# Altium integrated library 860010374011_Altium_WCAP-ATG8_rev19a.IntLib: 195 symbols (part 1 of 2) (continued)
## 860010575014
designator C?, comment 560uF, 35V
WCAP-ATG8 THT Aluminum Electrolytic Capacitors, D10mm x L20mm, 560uF, +/-20%, 35VDC; Part Number: 860010575014; Dissipation Factor: 12%; Endurance: 2000h; Leakage Current: 196uA; Ripple Current max.: 847mA; Technical Reference: ATBF200561M035DSPAAB000; ComponentLink1Description: Manufacturer; ComponentLink1URL: http://www.we-online.de; ComponentLink2Description: Datasheet; ComponentLink2URL: https://katalog.we-online.com/pbs/datasheet/860010575014.pdf; Length: 20mm; Mounting Technology: THT; Operating Temperature: -40 to +85degC; Packaging: Ammo Pack; Published Date: August 2019; Capacitance: 560uF; Diameter: 10mm; Publisher: Wurth Elektronik; Capacitance Tolerance: +/-20%; Rated Voltage: 35VDC
footprint WCAP-ATG8_10x20
pins: 1 N, 2 P

## 860010575015
designator C?, comment 680uF, 35V
WCAP-ATG8 THT Aluminum Electrolytic Capacitors, D10mm x L20mm, 680uF, +/-20%, 35VDC; Part Number: 860010575015; Dissipation Factor: 12%; Endurance: 2000h; Leakage Current: 238uA; Ripple Current max.: 891mA; Technical Reference: ATBF200681M035DSPAAB000; ComponentLink1Description: Manufacturer; ComponentLink1URL: http://www.we-online.de; ComponentLink2Description: Datasheet; ComponentLink2URL: https://katalog.we-online.com/pbs/datasheet/860010575015.pdf; Length: 20mm; Mounting Technology: THT; Operating Temperature: -40 to +85degC; Packaging: Ammo Pack; Published Date: August 2019; Capacitance: 680uF; Diameter: 10mm; Publisher: Wurth Elektronik; Capacitance Tolerance: +/-20%; Rated Voltage: 35VDC
footprint WCAP-ATG8_10x20
pins: 1 N, 2 P

## 860010578016
designator C?, comment 820uF, 35V
WCAP-ATG8 THT Aluminum Electrolytic Capacitors, D13mm x L20mm, 820uF, +/-20%, 35VDC; Part Number: 860010578016; Dissipation Factor: 12%; Endurance: 2000h; Leakage Current: 287uA; Ripple Current max.: 1045mA; Technical Reference: ATBI200821M035DSPACB000; ComponentLink1Description: Manufacturer; ComponentLink1URL: http://www.we-online.de; ComponentLink2Description: Datasheet; ComponentLink2URL: https://katalog.we-online.com/pbs/datasheet/860010578016.pdf; Length: 20mm; Mounting Technology: THT; Operating Temperature: -40 to +85degC; Packaging: Ammo Pack; Published Date: August 2019; Capacitance: 820uF; Diameter: 13mm; Publisher: Wurth Elektronik; Capacitance Tolerance: +/-20%; Rated Voltage: 35VDC
footprint WCAP-ATG8_13x20
pins: 1 N, 2 P

## 860010578017
designator C?, comment 1000uF, 35V
WCAP-ATG8 THT Aluminum Electrolytic Capacitors, D13mm x L20mm, 1000uF, +/-20%, 35VDC; Part Number: 860010578017; Dissipation Factor: 12%; Endurance: 2000h; Leakage Current: 350uA; Ripple Current max.: 1265mA; Technical Reference: ATBI200102M035DSPACB000; ComponentLink1Description: Manufacturer; ComponentLink1URL: http://www.we-online.de; ComponentLink2Description: Datasheet; ComponentLink2URL: https://katalog.we-online.com/pbs/datasheet/860010578017.pdf; Length: 20mm; Mounting Technology: THT; Operating Temperature: -40 to +85degC; Packaging: Ammo Pack; Published Date: August 2019; Capacitance: 1000uF; Diameter: 13mm; Publisher: Wurth Elektronik; Capacitance Tolerance: +/-20%; Rated Voltage: 35VDC
footprint WCAP-ATG8_13x20
pins: 1 N, 2 P

## 860010578018
designator C?, comment 1200uF, 35V
WCAP-ATG8 THT Aluminum Electrolytic Capacitors, D13mm x L20mm, 1200uF, +/-20%, 35VDC; Part Number: 860010578018; Dissipation Factor: 12%; Endurance: 2000h; Leakage Current: 420uA; Ripple Current max.: 1375mA; Technical Reference: ATBI200122M035DSPACB000; ComponentLink1Description: Manufacturer; ComponentLink1URL: http://www.we-online.de; ComponentLink2Description: Datasheet; ComponentLink2URL: https://katalog.we-online.com/pbs/datasheet/860010578018.pdf; Length: 20mm; Mounting Technology: THT; Operating Temperature: -40 to +85degC; Packaging: Ammo Pack; Published Date: August 2019; Capacitance: 1200uF; Diameter: 13mm; Publisher: Wurth Elektronik; Capacitance Tolerance: +/-20%; Rated Voltage: 35VDC
footprint WCAP-ATG8_13x20
pins: 1 N, 2 P

## 860010578019
designator C?, comment 1500uF, 35V
WCAP-ATG8 THT Aluminum Electrolytic Capacitors, D13mm x L25mm, 1500uF, +/-20%, 35VDC; Part Number: 860010578019; Dissipation Factor: 12%; Endurance: 2000h; Leakage Current: 525uA; Ripple Current max.: 1570mA; Technical Reference: ATBI250152M035DSPACB000; ComponentLink1Description: Manufacturer; ComponentLink1URL: http://www.we-online.de; ComponentLink2Description: Datasheet; ComponentLink2URL: https://katalog.we-online.com/pbs/datasheet/860010578019.pdf; Length: 25mm; Mounting Technology: THT; Operating Temperature: -40 to +85degC; Packaging: Ammo Pack; Published Date: August 2019; Capacitance: 1500uF; Diameter: 13mm; Publisher: Wurth Elektronik; Capacitance Tolerance: +/-20%; Rated Voltage: 35VDC
footprint WCAP-ATG8_13x25
pins: 1 N, 2 P

## 860010580020
designator C?, comment 1800uF, 35V
WCAP-ATG8 THT Aluminum Electrolytic Capacitors, D16mm x L25mm, 1800uF, +/-20%, 35VDC; Part Number: 860010580020; Dissipation Factor: 12%; Endurance: 2000h; Leakage Current: 630uA; Ripple Current max.: 1749mA; Technical Reference: ATBK250182M035DSPAEB000; ComponentLink1Description: Manufacturer; ComponentLink1URL: http://www.we-online.de; ComponentLink2Description: Datasheet; ComponentLink2URL: https://katalog.we-online.com/pbs/datasheet/860010580020.pdf; Length: 25mm; Mounting Technology: THT; Operating Temperature: -40 to +85degC; Packaging: Ammo Pack; Published Date: August 2019; Capacitance: 1800uF; Diameter: 16mm; Publisher: Wurth Elektronik; Capacitance Tolerance: +/-20%; Rated Voltage: 35VDC
footprint WCAP-ATG8_16x25
pins: 1 N, 2 P

## 860010580021
designator C?, comment 2200uF, 35V
WCAP-ATG8 THT Aluminum Electrolytic Capacitors, D16mm x L25mm, 2200uF, +/-20%, 35VDC; Part Number: 860010580021; Dissipation Factor: 14%; Endurance: 2000h; Leakage Current: 770uA; Ripple Current max.: 1870mA; Technical Reference: ATBK250222M035DSPAEB000; ComponentLink1Description: Manufacturer; ComponentLink1URL: http://www.we-online.de; ComponentLink2Description: Datasheet; ComponentLink2URL: https://katalog.we-online.com/pbs/datasheet/860010580021.pdf; Length: 25mm; Mounting Technology: THT; Operating Temperature: -40 to +85degC; Packaging: Ammo Pack; Published Date: August 2019; Capacitance: 2200uF; Diameter: 16mm; Publisher: Wurth Elektronik; Capacitance Tolerance: +/-20%; Rated Voltage: 35VDC
footprint WCAP-ATG8_16x25
pins: 1 N, 2 P

## 860010580022
designator C?, comment 2700uF, 35V
WCAP-ATG8 THT Aluminum Electrolytic Capacitors, D16mm x L31.5mm, 2700uF, +/-20%, 35VDC; Part Number: 860010580022; Dissipation Factor: 14%; Endurance: 2000h; Leakage Current: 945uA; Ripple Current max.: 2178mA; Technical Reference: ATBK315272M035DSPADB000; ComponentLink1Description: Manufacturer; ComponentLink1URL: http://www.we-online.de; ComponentLink2Description: Datasheet; ComponentLink2URL: https://katalog.we-online.com/pbs/datasheet/860010580022.pdf; Length: 31.5mm; Mounting Technology: THT; Operating Temperature: -40 to +85degC; Packaging: Ammo Pack; Published Date: August 2019; Capacitance: 2700uF; Diameter: 16mm; Publisher: Wurth Elektronik; Capacitance Tolerance: +/-20%; Rated Voltage: 35VDC
footprint WCAP-ATG8_16x31.5
pins: 1 N, 2 P

## 860010580023
designator C?, comment 3300uF, 35V
WCAP-ATG8 THT Aluminum Electrolytic Capacitors, D16mm x L31.5mm, 3300uF, +/-20%, 35VDC; Part Number: 860010580023; Dissipation Factor: 16%; Endurance: 2000h; Leakage Current: 1155uA; Ripple Current max.: 2365mA; Technical Reference: ATBK315332M035DSPADB000; ComponentLink1Description: Manufacturer; ComponentLink1URL: http://www.we-online.de; ComponentLink2Description: Datasheet; ComponentLink2URL: https://katalog.we-online.com/pbs/datasheet/860010580023.pdf; Length: 31.5mm; Mounting Technology: THT; Operating Temperature: -40 to +85degC; Packaging: Ammo Pack; Published Date: August 2019; Capacitance: 3300uF; Diameter: 16mm; Publisher: Wurth Elektronik; Capacitance Tolerance: +/-20%; Rated Voltage: 35VDC
footprint WCAP-ATG8_16x31.5
pins: 1 N, 2 P

## 860010581024
designator C?, comment 3900uF, 35V
WCAP-ATG8 THT Aluminum Electrolytic Capacitors, D18mm x L31.5mm, 3900uF, +/-20%, 35VDC; Part Number: 860010581024; Dissipation Factor: 16%; Endurance: 2000h; Leakage Current: 1365uA; Ripple Current max.: 2640mA; Technical Reference: ATBL315392M035DSPAEB000; ComponentLink1Description: Manufacturer; ComponentLink1URL: http://www.we-online.de; ComponentLink2Description: Datasheet; ComponentLink2URL: https://katalog.we-online.com/pbs/datasheet/860010581024.pdf; Length: 31.5mm; Mounting Technology: THT; Operating Temperature: -40 to +85degC; Packaging: Ammo Pack; Published Date: August 2019; Capacitance: 3900uF; Diameter: 18mm; Publisher: Wurth Elektronik; Capacitance Tolerance: +/-20%; Rated Voltage: 35VDC
footprint WCAP-ATG8_18x31.5
pins: 1 N, 2 P

## 860010581025
designator C?, comment 4700uF, 35V
WCAP-ATG8 THT Aluminum Electrolytic Capacitors, D18mm x L35.5mm, 4700uF, +/-20%, 35VDC; Part Number: 860010581025; Dissipation Factor: 18%; Endurance: 2000h; Leakage Current: 1645uA; Ripple Current max.: 2860mA; Technical Reference: ATBL355472M035DSPAEB000; ComponentLink1Description: Manufacturer; ComponentLink1URL: http://www.we-online.de; ComponentLink2Description: Datasheet; ComponentLink2URL: https://katalog.we-online.com/pbs/datasheet/860010581025.pdf; Length: 35.5mm; Mounting Technology: THT; Operating Temperature: -40 to +85degC; Packaging: Ammo Pack; Published Date: August 2019; Capacitance: 4700uF; Diameter: 18mm; Publisher: Wurth Elektronik; Capacitance Tolerance: +/-20%; Rated Voltage: 35VDC
footprint WCAP-ATG8_18x35.5
pins: 1 N, 2 P

## 860010581026
designator C?, comment 5600uF, 35V
WCAP-ATG8 THT Aluminum Electrolytic Capacitors, D18mm x L41mm, 5600uF, +/-20%, 35VDC; Part Number: 860010581026; Dissipation Factor: 20%; Endurance: 2000h; Leakage Current: 1960uA; Ripple Current max.: 2915mA; Technical Reference: ATBL410562M035DSPS1B000; ComponentLink1Description: Manufacturer; ComponentLink1URL: http://www.we-online.de; ComponentLink2Description: Datasheet; ComponentLink2URL: https://katalog.we-online.com/pbs/datasheet/860010581026.pdf; Length: 41mm; Mounting Technology: THT; Operating Temperature: -40 to +85degC; Packaging: Ammo Pack; Published Date: August 2019; Capacitance: 5600uF; Diameter: 18mm; Publisher: Wurth Elektronik; Capacitance Tolerance: +/-20%; Rated Voltage: 35VDC
footprint WCAP-ATG8_18x41
pins: 1 N, 2 P

## 860010583027
designator C?, comment 6800uF, 35V
WCAP-ATG8 THT Aluminum Electrolytic Capacitors, D22mm x L41mm, 6800uF, +/-20%, 35VDC; Part Number: 860010583027; Dissipation Factor: 22%; Endurance: 2000h; Leakage Current: 2380uA; Ripple Current max.: 3630mA; Technical Reference: ATBN410682M035DSPS2B000; ComponentLink1Description: Manufacturer; ComponentLink1URL: http://www.we-online.de; ComponentLink2Description: Datasheet; ComponentLink2URL: https://katalog.we-online.com/pbs/datasheet/860010583027.pdf; Length: 41mm; Mounting Technology: THT; Operating Temperature: -40 to +85degC; Packaging: Ammo Pack; Published Date: August 2019; Capacitance: 6800uF; Diameter: 22mm; Publisher: Wurth Elektronik; Capacitance Tolerance: +/-20%; Rated Voltage: 35VDC
footprint WCAP-ATG8_22x41
pins: 1 N, 2 P

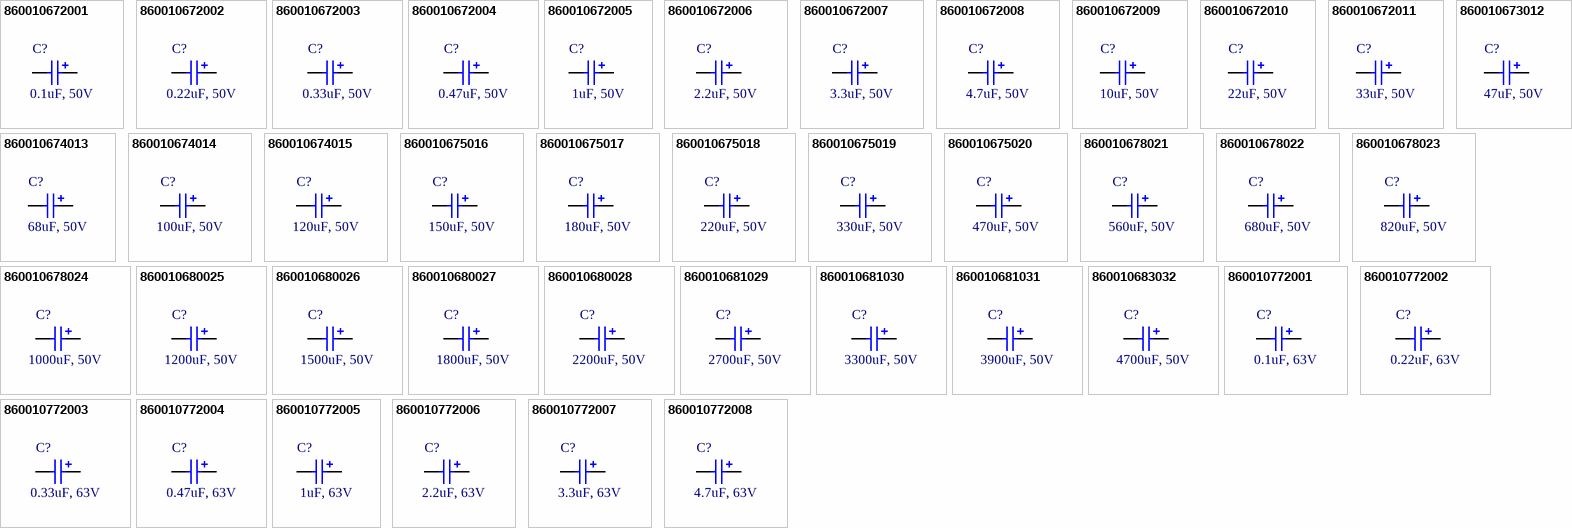
[diagram p3: symbols 860010672001 to 860010772008]

## 860010672001
designator C?, comment 0.1uF, 50V
WCAP-ATG8 THT Aluminum Electrolytic Capacitors, D5mm x L11mm, 0.1uF, +/-20%, 50VDC; Part Number: 860010672001; Dissipation Factor: 10%; Endurance: 2000h; Leakage Current: 3uA; Ripple Current max.: 3.3mA; Technical Reference: ATBC110R10M050DSPA3B000; ComponentLink1Description: Manufacturer; ComponentLink1URL: http://www.we-online.de; ComponentLink2Description: Datasheet; ComponentLink2URL: https://katalog.we-online.com/pbs/datasheet/860010672001.pdf; Length: 11mm; Mounting Technology: THT; Operating Temperature: -40 to +85degC; Packaging: Ammo Pack; Published Date: August 2019; Capacitance: 0.1uF; Diameter: 5mm; Publisher: Wurth Elektronik; Capacitance Tolerance: +/-20%; Rated Voltage: 50VDC
footprint WCAP-ATG8_5x11
pins: 1 N, 2 P

## 860010672002
designator C?, comment 0.22uF, 50V
WCAP-ATG8 THT Aluminum Electrolytic Capacitors, D5mm x L11mm, 0.22uF, +/-20%, 50VDC; Part Number: 860010672002; Dissipation Factor: 10%; Endurance: 2000h; Leakage Current: 3uA; Ripple Current max.: 3.3mA; Technical Reference: ATBC110R22M050DSPA3B000; ComponentLink1Description: Manufacturer; ComponentLink1URL: http://www.we-online.de; ComponentLink2Description: Datasheet; ComponentLink2URL: https://katalog.we-online.com/pbs/datasheet/860010672002.pdf; Length: 11mm; Mounting Technology: THT; Operating Temperature: -40 to +85degC; Packaging: Ammo Pack; Published Date: August 2019; Capacitance: 0.22uF; Diameter: 5mm; Publisher: Wurth Elektronik; Capacitance Tolerance: +/-20%; Rated Voltage: 50VDC
footprint WCAP-ATG8_5x11
pins: 1 N, 2 P

## 860010672003
designator C?, comment 0.33uF, 50V
WCAP-ATG8 THT Aluminum Electrolytic Capacitors, D5mm x L11mm, 0.33uF, +/-20%, 50VDC; Part Number: 860010672003; Dissipation Factor: 10%; Endurance: 2000h; Leakage Current: 3uA; Ripple Current max.: 5.5mA; Technical Reference: ATBC110R33M050DSPA3B000; ComponentLink1Description: Manufacturer; ComponentLink1URL: http://www.we-online.de; ComponentLink2Description: Datasheet; ComponentLink2URL: https://katalog.we-online.com/pbs/datasheet/860010672003.pdf; Length: 11mm; Mounting Technology: THT; Operating Temperature: -40 to +85degC; Packaging: Ammo Pack; Published Date: August 2019; Capacitance: 0.33uF; Diameter: 5mm; Publisher: Wurth Elektronik; Capacitance Tolerance: +/-20%; Rated Voltage: 50VDC
footprint WCAP-ATG8_5x11
pins: 1 N, 2 P

## 860010672004
designator C?, comment 0.47uF, 50V
WCAP-ATG8 THT Aluminum Electrolytic Capacitors, D5mm x L11mm, 0.47uF, +/-20%, 50VDC; Part Number: 860010672004; Dissipation Factor: 10%; Endurance: 2000h; Leakage Current: 3uA; Ripple Current max.: 7.5mA; Technical Reference: ATBC110R47M050DSPA3B000; ComponentLink1Description: Manufacturer; ComponentLink1URL: http://www.we-online.de; ComponentLink2Description: Datasheet; ComponentLink2URL: https://katalog.we-online.com/pbs/datasheet/860010672004.pdf; Length: 11mm; Mounting Technology: THT; Operating Temperature: -40 to +85degC; Packaging: Ammo Pack; Published Date: August 2019; Capacitance: 0.47uF; Diameter: 5mm; Publisher: Wurth Elektronik; Capacitance Tolerance: +/-20%; Rated Voltage: 50VDC
footprint WCAP-ATG8_5x11
pins: 1 N, 2 P

## 860010672005
designator C?, comment 1uF, 50V
WCAP-ATG8 THT Aluminum Electrolytic Capacitors, D5mm x L11mm, 1uF, +/-20%, 50VDC; Part Number: 860010672005; Dissipation Factor: 10%; Endurance: 2000h; Leakage Current: 3uA; Ripple Current max.: 17mA; Technical Reference: ATBC110010M050DSPA3B000; ComponentLink1Description: Manufacturer; ComponentLink1URL: http://www.we-online.de; ComponentLink2Description: Datasheet; ComponentLink2URL: https://katalog.we-online.com/pbs/datasheet/860010672005.pdf; Length: 11mm; Mounting Technology: THT; Operating Temperature: -40 to +85degC; Packaging: Ammo Pack; Published Date: August 2019; Capacitance: 1uF; Diameter: 5mm; Publisher: Wurth Elektronik; Capacitance Tolerance: +/-20%; Rated Voltage: 50VDC
footprint WCAP-ATG8_5x11
pins: 1 N, 2 P

## 860010672006
designator C?, comment 2.2uF, 50V
WCAP-ATG8 THT Aluminum Electrolytic Capacitors, D5mm x L11mm, 2.2uF, +/-20%, 50VDC; Part Number: 860010672006; Dissipation Factor: 10%; Endurance: 2000h; Leakage Current: 3uA; Ripple Current max.: 28mA; Technical Reference: ATBC1102R2M050DSPA3B000; ComponentLink1Description: Manufacturer; ComponentLink1URL: http://www.we-online.de; ComponentLink2Description: Datasheet; ComponentLink2URL: https://katalog.we-online.com/pbs/datasheet/860010672006.pdf; Length: 11mm; Mounting Technology: THT; Operating Temperature: -40 to +85degC; Packaging: Ammo Pack; Published Date: August 2019; Capacitance: 2.2uF; Diameter: 5mm; Publisher: Wurth Elektronik; Capacitance Tolerance: +/-20%; Rated Voltage: 50VDC
footprint WCAP-ATG8_5x11
pins: 1 N, 2 P

## 860010672007
designator C?, comment 3.3uF, 50V
WCAP-ATG8 THT Aluminum Electrolytic Capacitors, D5mm x L11mm, 3.3uF, +/-20%, 50VDC; Part Number: 860010672007; Dissipation Factor: 10%; Endurance: 2000h; Leakage Current: 3uA; Ripple Current max.: 39mA; Technical Reference: ATBC1103R3M050DSPA3B000; ComponentLink1Description: Manufacturer; ComponentLink1URL: http://www.we-online.de; ComponentLink2Description: Datasheet; ComponentLink2URL: https://katalog.we-online.com/pbs/datasheet/860010672007.pdf; Length: 11mm; Mounting Technology: THT; Operating Temperature: -40 to +85degC; Packaging: Ammo Pack; Published Date: August 2019; Capacitance: 3.3uF; Diameter: 5mm; Publisher: Wurth Elektronik; Capacitance Tolerance: +/-20%; Rated Voltage: 50VDC
footprint WCAP-ATG8_5x11
pins: 1 N, 2 P

## 860010672008
designator C?, comment 4.7uF, 50V
WCAP-ATG8 THT Aluminum Electrolytic Capacitors, D5mm x L11mm, 4.7uF, +/-20%, 50VDC; Part Number: 860010672008; Dissipation Factor: 10%; Endurance: 2000h; Leakage Current: 3uA; Ripple Current max.: 46mA; Technical Reference: ATBC1104R7M050DSPA3B000; ComponentLink1Description: Manufacturer; ComponentLink1URL: http://www.we-online.de; ComponentLink2Description: Datasheet; ComponentLink2URL: https://katalog.we-online.com/pbs/datasheet/860010672008.pdf; Length: 11mm; Mounting Technology: THT; Operating Temperature: -40 to +85degC; Packaging: Ammo Pack; Published Date: August 2019; Capacitance: 4.7uF; Diameter: 5mm; Publisher: Wurth Elektronik; Capacitance Tolerance: +/-20%; Rated Voltage: 50VDC
footprint WCAP-ATG8_5x11
pins: 1 N, 2 P

## 860010672009
designator C?, comment 10uF, 50V
WCAP-ATG8 THT Aluminum Electrolytic Capacitors, D5mm x L11mm, 10uF, +/-20%, 50VDC; Part Number: 860010672009; Dissipation Factor: 10%; Endurance: 2000h; Leakage Current: 5uA; Ripple Current max.: 72mA; Technical Reference: ATBC110100M050DSPA3B000; ComponentLink1Description: Manufacturer; ComponentLink1URL: http://www.we-online.de; ComponentLink2Description: Datasheet; ComponentLink2URL: https://katalog.we-online.com/pbs/datasheet/860010672009.pdf; Length: 11mm; Mounting Technology: THT; Operating Temperature: -40 to +85degC; Packaging: Ammo Pack; Published Date: August 2019; Capacitance: 10uF; Diameter: 5mm; Publisher: Wurth Elektronik; Capacitance Tolerance: +/-20%; Rated Voltage: 50VDC
footprint WCAP-ATG8_5x11
pins: 1 N, 2 P

## 860010672010
designator C?, comment 22uF, 50V
WCAP-ATG8 THT Aluminum Electrolytic Capacitors, D5mm x L11mm, 22uF, +/-20%, 50VDC; Part Number: 860010672010; Dissipation Factor: 10%; Endurance: 2000h; Leakage Current: 11uA; Ripple Current max.: 110mA; Technical Reference: ATBC110220M050DSPA3B000; ComponentLink1Description: Manufacturer; ComponentLink1URL: http://www.we-online.de; ComponentLink2Description: Datasheet; ComponentLink2URL: https://katalog.we-online.com/pbs/datasheet/860010672010.pdf; Length: 11mm; Mounting Technology: THT; Operating Temperature: -40 to +85degC; Packaging: Ammo Pack; Published Date: August 2019; Capacitance: 22uF; Diameter: 5mm; Publisher: Wurth Elektronik; Capacitance Tolerance: +/-20%; Rated Voltage: 50VDC
footprint WCAP-ATG8_5x11
pins: 1 N, 2 P

## 860010672011
designator C?, comment 33uF, 50V
WCAP-ATG8 THT Aluminum Electrolytic Capacitors, D5mm x L11mm, 33uF, +/-20%, 50VDC; Part Number: 860010672011; Dissipation Factor: 10%; Endurance: 2000h; Leakage Current: 16.5uA; Ripple Current max.: 132mA; Technical Reference: ATBC110330M050DSPA3B000; ComponentLink1Description: Manufacturer; ComponentLink1URL: http://www.we-online.de; ComponentLink2Description: Datasheet; ComponentLink2URL: https://katalog.we-online.com/pbs/datasheet/860010672011.pdf; Length: 11mm; Mounting Technology: THT; Operating Temperature: -40 to +85degC; Packaging: Ammo Pack; Published Date: August 2019; Capacitance: 33uF; Diameter: 5mm; Publisher: Wurth Elektronik; Capacitance Tolerance: +/-20%; Rated Voltage: 50VDC
footprint WCAP-ATG8_5x11
pins: 1 N, 2 P

## 860010673012
designator C?, comment 47uF, 50V
WCAP-ATG8 THT Aluminum Electrolytic Capacitors, D6.3mm x L11mm, 47uF, +/-20%, 50VDC; Part Number: 860010673012; Dissipation Factor: 10%; Endurance: 2000h; Leakage Current: 23.5uA; Ripple Current max.: 165mA; Technical Reference: ATBD110470M050DSPA4B000; ComponentLink1Description: Manufacturer; ComponentLink1URL: http://www.we-online.de; ComponentLink2Description: Datasheet; ComponentLink2URL: https://katalog.we-online.com/pbs/datasheet/860010673012.pdf; Length: 11mm; Mounting Technology: THT; Operating Temperature: -40 to +85degC; Packaging: Ammo Pack; Published Date: August 2019; Capacitance: 47uF; Diameter: 6.3mm; Publisher: Wurth Elektronik; Capacitance Tolerance: +/-20%; Rated Voltage: 50VDC
footprint WCAP-ATG8_6.3x11
pins: 1 N, 2 P

## 860010674013
designator C?, comment 68uF, 50V
WCAP-ATG8 THT Aluminum Electrolytic Capacitors, D8mm x L11.5mm, 68uF, +/-20%, 50VDC; Part Number: 860010674013; Dissipation Factor: 10%; Endurance: 2000h; Leakage Current: 34uA; Ripple Current max.: 220mA; Technical Reference: ATBE115680M050DSPA7B000; ComponentLink1Description: Manufacturer; ComponentLink1URL: http://www.we-online.de; ComponentLink2Description: Datasheet; ComponentLink2URL: https://katalog.we-online.com/pbs/datasheet/860010674013.pdf; Length: 11.5mm; Mounting Technology: THT; Operating Temperature: -40 to +85degC; Packaging: Ammo Pack; Published Date: August 2019; Capacitance: 68uF; Diameter: 8mm; Publisher: Wurth Elektronik; Capacitance Tolerance: +/-20%; Rated Voltage: 50VDC
footprint WCAP-ATG8_8x11.5
pins: 1 N, 2 P

## 860010674014
designator C?, comment 100uF, 50V
WCAP-ATG8 THT Aluminum Electrolytic Capacitors, D8mm x L11.5mm, 100uF, +/-20%, 50VDC; Part Number: 860010674014; Dissipation Factor: 10%; Endurance: 2000h; Leakage Current: 50uA; Ripple Current max.: 286mA; Technical Reference: ATBE115101M050DSPA7B000; ComponentLink1Description: Manufacturer; ComponentLink1URL: http://www.we-online.de; ComponentLink2Description: Datasheet; ComponentLink2URL: https://katalog.we-online.com/pbs/datasheet/860010674014.pdf; Length: 11.5mm; Mounting Technology: THT; Operating Temperature: -40 to +85degC; Packaging: Ammo Pack; Published Date: August 2019; Capacitance: 100uF; Diameter: 8mm; Publisher: Wurth Elektronik; Capacitance Tolerance: +/-20%; Rated Voltage: 50VDC
footprint WCAP-ATG8_8x11.5
pins: 1 N, 2 P

## 860010674015
designator C?, comment 120uF, 50V
WCAP-ATG8 THT Aluminum Electrolytic Capacitors, D8mm x L11.5mm, 120uF, +/-20%, 50VDC; Part Number: 860010674015; Dissipation Factor: 10%; Endurance: 2000h; Leakage Current: 60uA; Ripple Current max.: 319mA; Technical Reference: ATBE115121M050DSPA7B000; ComponentLink1Description: Manufacturer; ComponentLink1URL: http://www.we-online.de; ComponentLink2Description: Datasheet; ComponentLink2URL: https://katalog.we-online.com/pbs/datasheet/860010674015.pdf; Length: 11.5mm; Mounting Technology: THT; Operating Temperature: -40 to +85degC; Packaging: Ammo Pack; Published Date: August 2019; Capacitance: 120uF; Diameter: 8mm; Publisher: Wurth Elektronik; Capacitance Tolerance: +/-20%; Rated Voltage: 50VDC
footprint WCAP-ATG8_8x11.5
pins: 1 N, 2 P

## 860010675016
designator C?, comment 150uF, 50V
WCAP-ATG8 THT Aluminum Electrolytic Capacitors, D10mm x L12.5mm, 150uF, +/-20%, 50VDC; Part Number: 860010675016; Dissipation Factor: 10%; Endurance: 2000h; Leakage Current: 75uA; Ripple Current max.: 363mA; Technical Reference: ATBF125151M050DSPA9B000; ComponentLink1Description: Manufacturer; ComponentLink1URL: http://www.we-online.de; ComponentLink2Description: Datasheet; ComponentLink2URL: https://katalog.we-online.com/pbs/datasheet/860010675016.pdf; Length: 12.5mm; Mounting Technology: THT; Operating Temperature: -40 to +85degC; Packaging: Ammo Pack; Published Date: August 2019; Capacitance: 150uF; Diameter: 10mm; Publisher: Wurth Elektronik; Capacitance Tolerance: +/-20%; Rated Voltage: 50VDC
footprint WCAP-ATG8_10x12.5
pins: 1 N, 2 P

## 860010675017
designator C?, comment 180uF, 50V
WCAP-ATG8 THT Aluminum Electrolytic Capacitors, D10mm x L12.5mm, 180uF, +/-20%, 50VDC; Part Number: 860010675017; Dissipation Factor: 10%; Endurance: 2000h; Leakage Current: 90uA; Ripple Current max.: 418mA; Technical Reference: ATBF125181M050DSPA9B000; ComponentLink1Description: Manufacturer; ComponentLink1URL: http://www.we-online.de; ComponentLink2Description: Datasheet; ComponentLink2URL: https://katalog.we-online.com/pbs/datasheet/860010675017.pdf; Length: 12.5mm; Mounting Technology: THT; Operating Temperature: -40 to +85degC; Packaging: Ammo Pack; Published Date: August 2019; Capacitance: 180uF; Diameter: 10mm; Publisher: Wurth Elektronik; Capacitance Tolerance: +/-20%; Rated Voltage: 50VDC
footprint WCAP-ATG8_10x12.5
pins: 1 N, 2 P

## 860010675018
designator C?, comment 220uF, 50V
WCAP-ATG8 THT Aluminum Electrolytic Capacitors, D10mm x L12.5mm, 220uF, +/-20%, 50VDC; Part Number: 860010675018; Dissipation Factor: 10%; Endurance: 2000h; Leakage Current: 110uA; Ripple Current max.: 468mA; Technical Reference: ATBF125221M050DSPA9B000; ComponentLink1Description: Manufacturer; ComponentLink1URL: http://www.we-online.de; ComponentLink2Description: Datasheet; ComponentLink2URL: https://katalog.we-online.com/pbs/datasheet/860010675018.pdf; Length: 12.5mm; Mounting Technology: THT; Operating Temperature: -40 to +85degC; Packaging: Ammo Pack; Published Date: August 2019; Capacitance: 220uF; Diameter: 10mm; Publisher: Wurth Elektronik; Capacitance Tolerance: +/-20%; Rated Voltage: 50VDC
footprint WCAP-ATG8_10x12.5
pins: 1 N, 2 P

## 860010675019
designator C?, comment 330uF, 50V
WCAP-ATG8 THT Aluminum Electrolytic Capacitors, D10mm x L16mm, 330uF, +/-20%, 50VDC; Part Number: 860010675019; Dissipation Factor: 10%; Endurance: 2000h; Leakage Current: 165uA; Ripple Current max.: 649mA; Technical Reference: ATBF160331M050DSPAAB000; ComponentLink1Description: Manufacturer; ComponentLink1URL: http://www.we-online.de; ComponentLink2Description: Datasheet; ComponentLink2URL: https://katalog.we-online.com/pbs/datasheet/860010675019.pdf; Length: 16mm; Mounting Technology: THT; Operating Temperature: -40 to +85degC; Packaging: Ammo Pack; Published Date: August 2019; Capacitance: 330uF; Diameter: 10mm; Publisher: Wurth Elektronik; Capacitance Tolerance: +/-20%; Rated Voltage: 50VDC
footprint WCAP-ATG8_10x16
pins: 1 N, 2 P

## 860010675020
designator C?, comment 470uF, 50V
WCAP-ATG8 THT Aluminum Electrolytic Capacitors, D10mm x L20mm, 470uF, +/-20%, 50VDC; Part Number: 860010675020; Dissipation Factor: 10%; Endurance: 2000h; Leakage Current: 235uA; Ripple Current max.: 828mA; Technical Reference: ATBF200471M050DSPAAB000; ComponentLink1Description: Manufacturer; ComponentLink1URL: http://www.we-online.de; ComponentLink2Description: Datasheet; ComponentLink2URL: https://katalog.we-online.com/pbs/datasheet/860010675020.pdf; Length: 20mm; Mounting Technology: THT; Operating Temperature: -40 to +85degC; Packaging: Ammo Pack; Published Date: August 2019; Capacitance: 470uF; Diameter: 10mm; Publisher: Wurth Elektronik; Capacitance Tolerance: +/-20%; Rated Voltage: 50VDC
footprint WCAP-ATG8_10x20
pins: 1 N, 2 P

## 860010678021
designator C?, comment 560uF, 50V
WCAP-ATG8 THT Aluminum Electrolytic Capacitors, D13mm x L20mm, 560uF, +/-20%, 50VDC; Part Number: 860010678021; Dissipation Factor: 10%; Endurance: 2000h; Leakage Current: 280uA; Ripple Current max.: 902mA; Technical Reference: ATBI200561M050DSPACB000; ComponentLink1Description: Manufacturer; ComponentLink1URL: http://www.we-online.de; ComponentLink2Description: Datasheet; ComponentLink2URL: https://katalog.we-online.com/pbs/datasheet/860010678021.pdf; Length: 20mm; Mounting Technology: THT; Operating Temperature: -40 to +85degC; Packaging: Ammo Pack; Published Date: August 2019; Capacitance: 560uF; Diameter: 13mm; Publisher: Wurth Elektronik; Capacitance Tolerance: +/-20%; Rated Voltage: 50VDC
footprint WCAP-ATG8_13x20
pins: 1 N, 2 P

## 860010678022
designator C?, comment 680uF, 50V
WCAP-ATG8 THT Aluminum Electrolytic Capacitors, D13mm x L20mm, 680uF, +/-20%, 50VDC; Part Number: 860010678022; Dissipation Factor: 10%; Endurance: 2000h; Leakage Current: 340uA; Ripple Current max.: 1056mA; Technical Reference: ATBI200681M050DSPACB000; ComponentLink1Description: Manufacturer; ComponentLink1URL: http://www.we-online.de; ComponentLink2Description: Datasheet; ComponentLink2URL: https://katalog.we-online.com/pbs/datasheet/860010678022.pdf; Length: 20mm; Mounting Technology: THT; Operating Temperature: -40 to +85degC; Packaging: Ammo Pack; Published Date: August 2019; Capacitance: 680uF; Diameter: 13mm; Publisher: Wurth Elektronik; Capacitance Tolerance: +/-20%; Rated Voltage: 50VDC
footprint WCAP-ATG8_13x20
pins: 1 N, 2 P

## 860010678023
designator C?, comment 820uF, 50V
WCAP-ATG8 THT Aluminum Electrolytic Capacitors, D13mm x L25mm, 820uF, +/-20%, 50VDC; Part Number: 860010678023; Dissipation Factor: 10%; Endurance: 2000h; Leakage Current: 410uA; Ripple Current max.: 1287mA; Technical Reference: ATBI250821M050DSPACB000; ComponentLink1Description: Manufacturer; ComponentLink1URL: http://www.we-online.de; ComponentLink2Description: Datasheet; ComponentLink2URL: https://katalog.we-online.com/pbs/datasheet/860010678023.pdf; Length: 25mm; Mounting Technology: THT; Operating Temperature: -40 to +85degC; Packaging: Ammo Pack; Published Date: August 2019; Capacitance: 820uF; Diameter: 13mm; Publisher: Wurth Elektronik; Capacitance Tolerance: +/-20%; Rated Voltage: 50VDC
footprint WCAP-ATG8_13x25
pins: 1 N, 2 P